# Altium footprint library DSUB.PcbLib: 51 footprints (part 3 of 4)
Each footprint in its own frame and in the unit in brackets; x right, y up, seen from the top. Pads: shape width x height; smd on the part's side, far side on the other; paste and mask are expansions set on the pad; w line width, h text height; cw(c..) or ccw(c..) is an arc to the next point about the centre after c.
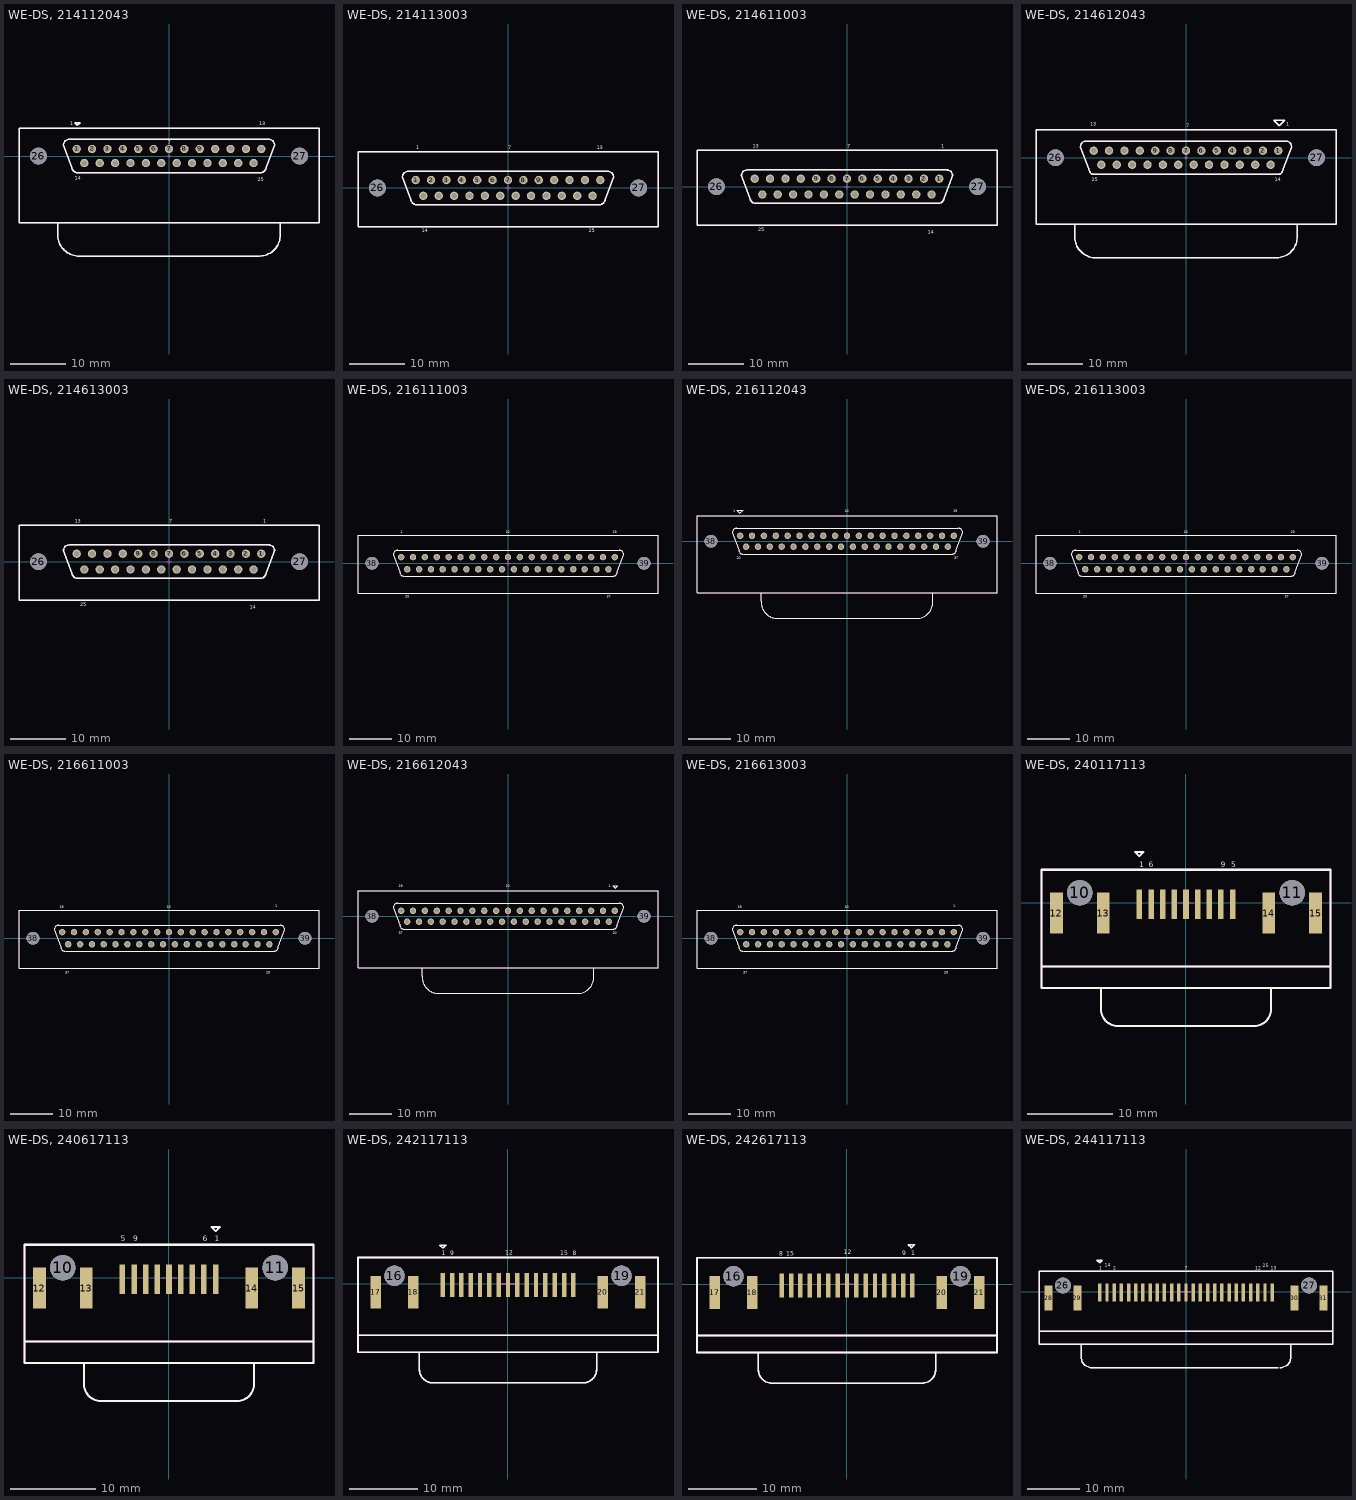
[diagram p2: the footprints below, top view; thin cyan lines are the x and y axes]

## WE-DS, 214112043 [mm] "D-SUB- 25P, MALE, RT ANGLE, TH"
height 12
pads (27):
  round 1.5 hole 1 unplated: 1(-16.62,1.27) 2(-13.85,1.27) 3(-11.08,1.27) 4(-8.31,1.27) 5(-5.54,1.27) 6(-2.77,1.27) 7(0,1.27) 8(2.77,1.27) 9(5.54,1.27) 10(8.31,1.27) 11(11.08,1.27) 12(13.85,1.27) 13(16.62,1.27) 14(-15.24,-1.27) 15(-12.47,-1.27) 16(-9.7,-1.27) 17(-6.93,-1.27) 18(-4.16,-1.27) 19(-1.39,-1.27) 20(1.38,-1.27) 21(4.15,-1.27) 22(6.92,-1.27) 23(9.69,-1.27) 24(12.46,-1.27) 25(15.23,-1.27)
  round 3 hole 3 unplated: 26(-23.5,0) 27(23.5,0)
Top Overlay:
  lines w0.254: -20,-12 -20,-14 ccw(c-16.25,-14.25) -16.5,-18 16,-18 ccw(c16.25,-14.25) 20,-14.5 20,-12 ; -16.5,5.5 -16.5,5.5 ; -16.5,5.5 -17,6 -16,6 -16.5,5.5 ; -27,-12 27,-12 27,5 -27,5 -27,-12 ; -19,2 cw(c-18,2) -18,3 18,3 cw(c18,2) 19,2 17.5,-2 cw(c16.5,-2) 16.5,-3 -16.5,-3 cw(c-16.5,-2) -17.5,-2 -19,2
  text "1" at -17.75,5.5 h0.64
  text "14" at -17,-4.25 h0.64
  text "7" at -0.2,2.1 h0.64
  text "13" at 16.25,5.5 h0.64
  text "25" at 16,-4.5 h0.64
Mechanical 15:
  lines w0.254: -20,-12 -20,-14 ccw(c-16.25,-14.25) -16.5,-18 16,-18 ccw(c16.25,-14.25) 20,-14.5 20,-12 ; -0.25,0 0.25,0 ; 0,-0.25 0,0.25 ; -27,-12 -27,5 27,5 27,-12 -27,-12 ; -19,2 cw(c-18,2) -18,3 18,3 cw(c18,2) 19,2 17.5,-2 cw(c16.5,-2) 16.5,-3 -16.5,-3 cw(c-16.5,-2) -17.5,-2 -19,2
3D body "214112043.stp": height 13.2, standoff -3.6, extent -26.55,-17.5 26.55,4.2

## WE-DS, 214113003 [mm] "D-SUB- 25P, MALE, SOLDER BUCKET,TH"
height 12
pads (27):
  round 1.5 hole 1 unplated: 1(-16.62,1.42) 2(-13.85,1.42) 3(-11.08,1.42) 4(-8.31,1.42) 5(-5.54,1.42) 6(-2.77,1.42) 7(0,1.42) 8(2.77,1.42) 9(5.54,1.42) 10(8.31,1.42) 11(11.08,1.42) 12(13.85,1.42) 13(16.62,1.42) 14(-15.24,-1.42) 15(-12.47,-1.42) 16(-9.7,-1.42) 17(-6.93,-1.42) 18(-4.16,-1.42) 19(-1.39,-1.42) 20(1.38,-1.42) 21(4.15,-1.42) 22(6.92,-1.42) 23(9.69,-1.42) 24(12.46,-1.42) 25(15.23,-1.42)
  round 3 hole 3 unplated: 26(-23.5,0) 27(23.5,0)
Top Overlay:
  lines w0.254: -27,-7 -27,6.5 27,6.5 27,-7 -27,-7 ; -19,2 cw(c-18,2) -18,3 18,3 cw(c18,2) 19,2 17.5,-2 cw(c16.5,-2) 16.5,-3 -16.5,-3 cw(c-16.5,-2) -17.5,-2 -19,2
  text "14" at -15.5,-8 h0.64
  text "25" at 14.5,-8 h0.64
  text "13" at 16,7 h0.64
  text "7" at 0,7 h0.64
  text "1" at -16.5,7 h0.64
Mechanical 15:
  lines w0.102: -0.5,0 0.5,0 ; 0,-0.5 0,0.5
  lines w0.254: -27,-7 27,-7 27,6.5 -27,6.5 -27,-7 ; -19,2 cw(c-18,2) -18,3 18,3 cw(c18,2) 19,2 17.5,-2 cw(c16.5,-2) 16.5,-3 -16.5,-3 cw(c-16.5,-2) -17.5,-2 -19,2

## WE-DS, 214611003 [mm] "D-SUB- 25P, FEMALE, STRAIGHT, TH"
height 12
pads (27):
  round 1.5 hole 1 unplated: 1(16.62,1.42) 2(13.85,1.42) 3(11.08,1.42) 4(8.31,1.42) 5(5.54,1.42) 6(2.77,1.42) 7(0,1.42) 8(-2.77,1.42) 9(-5.54,1.42) 10(-8.31,1.42) 11(-11.08,1.42) 12(-13.85,1.42) 13(-16.62,1.42) 14(15.23,-1.42) 15(12.46,-1.42) 16(9.69,-1.42) 17(6.92,-1.42) 18(4.15,-1.42) 19(1.38,-1.42) 20(-1.39,-1.42) 21(-4.16,-1.42) 22(-6.93,-1.42) 23(-9.7,-1.42) 24(-12.47,-1.42) 25(-15.24,-1.42)
  round 3 hole 3 unplated: 26(-23.5,0) 27(23.5,0)
Top Overlay:
  lines w0.254: -27,-7 27,-7 27,6.5 -27,6.5 -27,-7 ; -19,2 cw(c-18,2) -18,3 18,3 cw(c18,2) 19,2 17.5,-2 cw(c16.5,-2) 16.5,-3 -16.5,-3 cw(c-16.5,-2) -17.5,-2 -19,2
  text "13" at -17,7 h0.64
  text "7" at 0,7 h0.64
  text "1" at 17,7 h0.64
  text "14" at 14.5,-8.5 h0.64
  text "25" at -16,-8 h0.64
Mechanical 15:
  lines w0.102: -0.5,0 0.5,0 ; 0,-0.5 0,0.5
  lines w0.254: -27,-7 -27,6.5 27,6.5 27,-7 -27,-7 ; -19,2 cw(c-18,2) -18,3 18,3 cw(c18,2) 19,2 17.5,-2 cw(c16.5,-2) 16.5,-3 -16.5,-3 cw(c-16.5,-2) -17.5,-2 -19,2

## WE-DS, 214612043 [mm] "D-SUB- 25P, FEMALE, RT ANGLE, TH"
height 12
pads (27):
  round 1.5 hole 1 unplated: 1(16.62,1.27) 2(13.85,1.27) 3(11.08,1.27) 4(8.31,1.27) 5(5.54,1.27) 6(2.77,1.27) 7(0,1.27) 8(-2.77,1.27) 9(-5.54,1.27) 10(-8.31,1.27) 11(-11.08,1.27) 12(-13.85,1.27) 13(-16.62,1.27) 14(15.23,-1.27) 15(12.46,-1.27) 16(9.69,-1.27) 17(6.92,-1.27) 18(4.15,-1.27) 19(1.38,-1.27) 20(-1.39,-1.27) 21(-4.16,-1.27) 22(-6.93,-1.27) 23(-9.7,-1.27) 24(-12.47,-1.27) 25(-15.24,-1.27)
  round 3 hole 3 unplated: 26(-23.5,0) 27(23.5,0)
Top Overlay:
  lines w0.254: -20,-12 -20,-14 ccw(c-16.25,-14.25) -16.5,-18 16,-18 ccw(c16.25,-14.25) 20,-14.5 20,-12 ; 16.75,5.75 15.75,6.75 17.75,6.75 16.75,5.75 ; 16.75,5.75 16.75,5.75 ; -27,-12 27,-12 27,5 -27,5 -27,-12 ; -19,2 cw(c-18,2) -18,3 18,3 cw(c18,2) 19,2 17.5,-2 cw(c16.5,-2) 16.5,-3 -16.5,-3 cw(c-16.5,-2) -17.5,-2 -19,2
  text "7" at 0,5.5 h0.64
  text "14" at 16,-4.25 h0.64
  text "1" at 18,5.75 h0.64
  text "13" at -17.25,5.75 h0.64
  text "25" at -17,-4.25 h0.64
Mechanical 15:
  lines w0.254: -20,-12 -20,-14 ccw(c-16.25,-14.25) -16.5,-18 16,-18 ccw(c16.25,-14.25) 20,-14.5 20,-12 ; -0.25,0 0.25,0 ; 0,-0.25 0,0.25 ; -27,-12 -27,5 27,5 27,-12 -27,-12 ; -19,2 cw(c-18,2) -18,3 18,3 cw(c18,2) 19,2 17.5,-2 cw(c16.5,-2) 16.5,-3 -16.5,-3 cw(c-16.5,-2) -17.5,-2 -19,2

## WE-DS, 214613003 [mm] "D-SUB- 25P, FEMALE, SOLDER BUCKET, TH"
height 12
pads (27):
  round 1.5 hole 1 unplated: 1(16.62,1.42) 2(13.85,1.42) 3(11.08,1.42) 4(8.31,1.42) 5(5.54,1.42) 6(2.77,1.42) 7(0,1.42) 8(-2.77,1.42) 9(-5.54,1.42) 10(-8.31,1.42) 11(-11.08,1.42) 12(-13.85,1.42) 13(-16.62,1.42) 14(15.23,-1.42) 15(12.46,-1.42) 16(9.69,-1.42) 17(6.92,-1.42) 18(4.15,-1.42) 19(1.38,-1.42) 20(-1.39,-1.42) 21(-4.16,-1.42) 22(-6.93,-1.42) 23(-9.7,-1.42) 24(-12.47,-1.42) 25(-15.24,-1.42)
  round 3 hole 3 unplated: 26(-23.5,0) 27(23.5,0)
Top Overlay:
  lines w0.254: -27,-7 -27,6.5 27,6.5 27,-7 -27,-7 ; -19,2 cw(c-18,2) -18,3 18,3 cw(c18,2) 19,2 17.5,-2 cw(c16.5,-2) 16.5,-3 -16.5,-3 cw(c-16.5,-2) -17.5,-2 -19,2
  text "25" at -16,-8 h0.64
  text "14" at 14.5,-8.5 h0.64
  text "1" at 17,7 h0.64
  text "7" at 0,7 h0.64
  text "13" at -17,7 h0.64
Mechanical 15:
  lines w0.102: -0.5,0 0.5,0 ; 0,-0.5 0,0.5
  lines w0.254: -27,-7 27,-7 27,6.5 -27,6.5 -27,-7 ; -19,2 cw(c-18,2) -18,3 18,3 cw(c18,2) 19,2 17.5,-2 cw(c16.5,-2) 16.5,-3 -16.5,-3 cw(c-16.5,-2) -17.5,-2 -19,2

## WE-DS, 216111003 [mm] "D-SUB- 37P, MALE, STRAIGHT, TH"
height 12
pads (39):
  round 1.5 hole 1 unplated: 1(-24.93,1.42) 2(-22.16,1.42) 3(-19.39,1.42) 4(-16.62,1.42) 5(-13.85,1.42) 6(-11.08,1.42) 7(-8.31,1.42) 8(-5.54,1.42) 9(-2.77,1.42) 10(0,1.42) 11(2.77,1.42) 12(5.54,1.42) 13(8.31,1.42) 14(11.08,1.42) 15(13.85,1.42) 16(16.62,1.42) 17(19.39,1.42) 18(22.16,1.42) 19(24.93,1.42) 20(-23.52,-1.42) 21(-20.75,-1.42) 22(-17.98,-1.42) 23(-15.24,-1.42) 24(-12.47,-1.42) 25(-9.7,-1.42) 26(-6.93,-1.42) 27(-4.16,-1.42) 28(-1.39,-1.42) 29(1.38,-1.42) 30(4.15,-1.42) 31(6.92,-1.42) 32(9.69,-1.42) 33(12.46,-1.42) 34(15.23,-1.42) 35(17.88,-1.42) 36(20.65,-1.42) 37(23.42,-1.42)
  round 3 hole 3 unplated: 38(-31.75,0) 39(31.75,0)
Top Overlay:
  lines w0.254: -26,3 26,3 cw(c26,2) 27,2 25.5,-2 cw(c24.5,-2) 24.5,-3 -24,-3 ; -25.75,3 ccw(c-25.75,2) -26.75,2 -25.25,-2 ccw(c-24.25,-2) -24.25,-3 ; -35,-7 35,-7 35,6.5 -35,6.5 -35,-7
  text "1" at -25,7 h0.64
  text "10" at -0.5,7 h0.64
  text "19" at 24.5,7 h0.64
  text "37" at 23,-8 h0.64
  text "20" at -24,-8 h0.64
Mechanical 15:
  lines w0.102: -0.5,0 0.5,0 ; 0,-0.5 0,0.5
  lines w0.254: -35,-7 -35,6.5 35,6.5 35,-7 -35,-7 ; -26.75,2 cw(c-25.75,2) -25.75,3 26,3 cw(c26,2) 27,2 25.5,-2 cw(c24.5,-2) 24.5,-3 -24.25,-3 cw(c-24.25,-2) -25.25,-2 -26.75,2

## WE-DS, 216112043 [mm] "D-SUB- 37P, MALE, RT ANGLE, TH"
height 12
pads (39):
  round 1.5 hole 1 unplated: 1(-24.93,1.27) 2(-22.16,1.27) 3(-19.39,1.27) 4(-16.62,1.27) 5(-13.85,1.27) 6(-11.08,1.27) 7(-8.31,1.27) 8(-5.54,1.27) 9(-2.77,1.27) 10(0,1.27) 11(2.77,1.27) 12(5.54,1.27) 13(8.31,1.27) 14(11.08,1.27) 15(13.85,1.27) 16(16.62,1.27) 17(19.39,1.27) 18(22.16,1.27) 19(24.93,1.27) 20(-23.55,-1.27) 21(-20.78,-1.27) 22(-18.01,-1.27) 23(-15.24,-1.27) 24(-12.47,-1.27) 25(-9.7,-1.27) 26(-6.93,-1.27) 27(-4.16,-1.27) 28(-1.39,-1.27) 29(1.38,-1.27) 30(4.15,-1.27) 31(6.92,-1.27) 32(9.69,-1.27) 33(12.46,-1.27) 34(15.23,-1.27) 35(18,-1.27) 36(20.77,-1.27) 37(23.54,-1.27)
  round 3 hole 3 unplated: 38(-31.75,0) 39(31.75,0)
Top Overlay:
  lines w0.254: -26,3 26,3 cw(c26,2) 27,2 25.5,-2 cw(c24.5,-2) 24.5,-3 -24,-3 ; -25.75,3 ccw(c-25.75,2) -26.75,2 -25.25,-2 ccw(c-24.25,-2) -24.25,-3 ; -20,-12 -20,-14 ccw(c-16.25,-14.25) -16.5,-18 16,-18 ccw(c16.25,-14.25) 20,-14.5 20,-12 ; -24.75,6.75 -25,6.5 -25.75,7.25 -25.5,7.25 -24.5,7.25 -24.25,7.25 -24.75,6.75 ; -24.75,6.75 -24.75,6.75 ; -35,-12 -35,6 35,6 35,-12 -35,-12
  text "1" at -26.5,6.75 h0.64
  text "10" at -0.5,6.75 h0.64
  text "19" at 24.75,6.75 h0.64
  text "37" at 25,-4.25 h0.64
  text "20" at -25.75,-4.25 h0.64
Mechanical 15:
  lines w0.254: -20,-12 -20,-14 ccw(c-16.25,-14.25) -16.5,-18 16,-18 ccw(c16.25,-14.25) 20,-14.5 20,-12 ; -0.25,0 0.25,0 ; 0,-0.25 0,0.25 ; -35,-12 35,-12 35,6 -35,6 -35,-12 ; -26.75,2 cw(c-25.75,2) -25.75,3 26,3 cw(c26,2) 27,2 25.5,-2 cw(c24.5,-2) 24.5,-3 -24.25,-3 cw(c-24.25,-2) -25.25,-2 -26.75,2

## WE-DS, 216113003 [mm] "D-SUB- 37P, MALE, SOLDER BUCKET, TH"
height 12
pads (39):
  round 1.5 hole 1 unplated: 1(-24.93,1.42) 2(-22.16,1.42) 3(-19.39,1.42) 4(-16.62,1.42) 5(-13.85,1.42) 6(-11.08,1.42) 7(-8.31,1.42) 8(-5.54,1.42) 9(-2.77,1.42) 10(0,1.42) 11(2.77,1.42) 12(5.54,1.42) 13(8.31,1.42) 14(11.08,1.42) 15(13.85,1.42) 16(16.62,1.42) 17(19.39,1.42) 18(22.16,1.42) 19(24.93,1.42) 20(-23.52,-1.42) 21(-20.75,-1.42) 22(-17.98,-1.42) 23(-15.24,-1.42) 24(-12.47,-1.42) 25(-9.7,-1.42) 26(-6.93,-1.42) 27(-4.16,-1.42) 28(-1.39,-1.42) 29(1.38,-1.42) 30(4.15,-1.42) 31(6.92,-1.42) 32(9.69,-1.42) 33(12.46,-1.42) 34(15.23,-1.42) 35(17.88,-1.42) 36(20.65,-1.42) 37(23.42,-1.42)
  round 3 hole 3 unplated: 38(-31.75,0) 39(31.75,0)
Top Overlay:
  lines w0.254: -26,3 26,3 cw(c26,2) 27,2 25.5,-2 cw(c24.5,-2) 24.5,-3 -24,-3 ; -25.75,3 ccw(c-25.75,2) -26.75,2 -25.25,-2 ccw(c-24.25,-2) -24.25,-3 ; -35,-7 -35,6.5 35,6.5 35,-7 -35,-7
  text "20" at -24,-8 h0.64
  text "37" at 23,-8 h0.64
  text "19" at 24.5,7 h0.64
  text "10" at -0.5,7 h0.64
  text "1" at -25,7 h0.64
Mechanical 15:
  lines w0.102: -0.5,0 0.5,0 ; 0,-0.5 0,0.5
  lines w0.254: -35,-7 35,-7 35,6.5 -35,6.5 -35,-7 ; -26.75,2 cw(c-25.75,2) -25.75,3 26,3 cw(c26,2) 27,2 25.5,-2 cw(c24.5,-2) 24.5,-3 -24.25,-3 cw(c-24.25,-2) -25.25,-2 -26.75,2

## WE-DS, 216611003 [mm] "D-SUB- 37P, FEMALE, STRAIGHT, TH"
height 12
pads (39):
  round 1.5 hole 1 unplated: 1(24.93,1.42) 2(22.16,1.42) 3(19.39,1.42) 4(16.62,1.42) 5(13.85,1.42) 6(11.08,1.42) 7(8.31,1.42) 8(5.54,1.42) 9(2.77,1.42) 10(0,1.42) 11(-2.77,1.42) 12(-5.54,1.42) 13(-8.31,1.42) 14(-11.08,1.42) 15(-13.85,1.42) 16(-16.62,1.42) 17(-19.39,1.42) 18(-22.16,1.42) 19(-24.93,1.42) 20(23.42,-1.42) 21(20.65,-1.42) 22(17.88,-1.42) 23(15.23,-1.42) 24(12.46,-1.42) 25(9.69,-1.42) 26(6.92,-1.42) 27(4.15,-1.42) 28(1.38,-1.42) 29(-1.39,-1.42) 30(-4.16,-1.42) 31(-6.93,-1.42) 32(-9.7,-1.42) 33(-12.47,-1.42) 34(-15.24,-1.42) 35(-17.98,-1.42) 36(-20.75,-1.42) 37(-23.52,-1.42)
  round 3 hole 3 unplated: 38(-31.75,0) 39(31.75,0)
Top Overlay:
  lines w0.254: -26,3 26,3 cw(c26,2) 27,2 25.5,-2 cw(c24.5,-2) 24.5,-3 -24,-3 ; -25.75,3 ccw(c-25.75,2) -26.75,2 -25.25,-2 ccw(c-24.25,-2) -24.25,-3 ; -35,-7 -35,6.5 35,6.5 35,-7 -35,-7
  text "20" at 22.75,-8.25 h0.64
  text "1" at 24.75,7.25 h0.64
  text "37" at -24.25,-8.25 h0.64
  text "19" at -25.5,7 h0.64
  text "10" at -0.5,7 h0.64
Mechanical 15:
  lines w0.102: -0.5,0 0.5,0 ; 0,-0.5 0,0.5
  lines w0.254: -35,-7 35,-7 35,6.5 -35,6.5 -35,-7 ; -26.75,2 cw(c-25.75,2) -25.75,3 26,3 cw(c26,2) 27,2 25.5,-2 cw(c24.5,-2) 24.5,-3 -24.25,-3 cw(c-24.25,-2) -25.25,-2 -26.75,2

## WE-DS, 216612043 [mm] "D-SUB- 37P, FEMALE, RT ANGLE, TH"
height 12
pads (39):
  round 1.5 hole 1 unplated: 1(24.93,1.27) 2(22.16,1.27) 3(19.39,1.27) 4(16.62,1.27) 5(13.85,1.27) 6(11.08,1.27) 7(8.31,1.27) 8(5.54,1.27) 9(2.77,1.27) 10(0,1.27) 11(-2.77,1.27) 12(-5.54,1.27) 13(-8.31,1.27) 14(-11.08,1.27) 15(-13.85,1.27) 16(-16.62,1.27) 17(-19.39,1.27) 18(-22.16,1.27) 19(-24.93,1.27) 20(23.54,-1.27) 21(20.77,-1.27) 22(18,-1.27) 23(15.23,-1.27) 24(12.46,-1.27) 25(9.69,-1.27) 26(6.92,-1.27) 27(4.15,-1.27) 28(1.38,-1.27) 29(-1.39,-1.27) 30(-4.16,-1.27) 31(-6.93,-1.27) 32(-9.7,-1.27) 33(-12.47,-1.27) 34(-15.24,-1.27) 35(-18.01,-1.27) 36(-20.78,-1.27) 37(-23.55,-1.27)
  round 3 hole 3 unplated: 38(-31.75,0) 39(31.75,0)
Top Overlay:
  lines w0.254: -20,-12 -20,-14 ccw(c-16.25,-14.25) -16.5,-18 16,-18 ccw(c16.25,-14.25) 20,-14.5 20,-12 ; -35,-12 35,-12 35,6 -35,6 -35,-12 ; -26.75,2 cw(c-25.75,2) -25.75,3 26,3 cw(c26,2) 27,2 25.5,-2 cw(c24.5,-2) 24.5,-3 -24.25,-3 cw(c-24.25,-2) -25.25,-2 -26.75,2 ; 24.4,7.1 25,6.5 25.6,7.1 24.4,7.1
  text "19" at -25.5,6.75 h0.64
  text "10" at -0.5,6.75 h0.64
  text "1" at 23.5,6.75 h0.64
  text "20" at 24.5,-4.25 h0.64
  text "37" at -25.5,-4.25 h0.64
Mechanical 15:
  lines w0.254: -24.25,-3 cw(c-24.25,-2) -25.25,-2 -26.75,2 cw(c-25.75,2) -25.75,3 26,3 cw(c26,2) 27,2 25.5,-2 cw(c24.5,-2) 24.5,-3 ; -24,-3 24.75,-3 ; -20,-12 -20,-14 ccw(c-16.25,-14.25) -16.5,-18 16,-18 ccw(c16.25,-14.25) 20,-14.5 20,-12 ; -0.25,0 0.25,0 ; 0,-0.25 0,0.25 ; -35,-12 35,-12 35,6 -35,6 -35,-12 ; 25,6.5 25,6.5

## WE-DS, 216613003 [mm] "D-SUB- 37P, FEMALE, SOLDER BUCKET, TH"
height 12
pads (39):
  round 1.5 hole 1 unplated: 1(24.93,1.42) 2(22.16,1.42) 3(19.39,1.42) 4(16.62,1.42) 5(13.85,1.42) 6(11.08,1.42) 7(8.31,1.42) 8(5.54,1.42) 9(2.77,1.42) 10(0,1.42) 11(-2.77,1.42) 12(-5.54,1.42) 13(-8.31,1.42) 14(-11.08,1.42) 15(-13.85,1.42) 16(-16.62,1.42) 17(-19.39,1.42) 18(-22.16,1.42) 19(-24.93,1.42) 20(23.42,-1.42) 21(20.65,-1.42) 22(17.88,-1.42) 23(15.23,-1.42) 24(12.46,-1.42) 25(9.69,-1.42) 26(6.92,-1.42) 27(4.15,-1.42) 28(1.38,-1.42) 29(-1.39,-1.42) 30(-4.16,-1.42) 31(-6.93,-1.42) 32(-9.7,-1.42) 33(-12.47,-1.42) 34(-15.24,-1.42) 35(-17.98,-1.42) 36(-20.75,-1.42) 37(-23.52,-1.42)
  round 3 hole 3 unplated: 38(-31.75,0) 39(31.75,0)
Top Overlay:
  lines w0.254: -26,3 26,3 cw(c26,2) 27,2 25.5,-2 cw(c24.5,-2) 24.5,-3 -24,-3 ; -25.75,3 ccw(c-25.75,2) -26.75,2 -25.25,-2 ccw(c-24.25,-2) -24.25,-3 ; -35,-7 -35,6.5 35,6.5 35,-7 -35,-7
  text "20" at 22.75,-8.25 h0.64
  text "1" at 24.75,7.25 h0.64
  text "37" at -24.25,-8.25 h0.64
  text "19" at -25.5,7 h0.64
  text "10" at -0.5,7 h0.64
Mechanical 15:
  lines w0.102: -0.5,0 0.5,0 ; 0,-0.5 0,0.5
  lines w0.254: -35,-7 35,-7 35,6.5 -35,6.5 -35,-7 ; -26.75,2 cw(c-25.75,2) -25.75,3 26,3 cw(c26,2) 27,2 25.5,-2 cw(c24.5,-2) 24.5,-3 -24.25,-3 cw(c-24.25,-2) -25.25,-2 -26.75,2

## WE-DS, 240117113 [mm] "D-SUB- 9P, MALE, RT ANGLE, SMT"
height 12.4
pads (15):
  rect 0.65x3.5 smd: 1(-5.48,-0.15) 2(-2.74,-0.15) 3(0,-0.15) 4(2.74,-0.15) 5(5.48,-0.15) 6(-4.11,-0.15) 7(-1.37,-0.15) 8(1.37,-0.15) 9(4.11,-0.15)
  round 3 hole 3 unplated: 10(-12.5,1.2) 11(12.5,1.2)
  rect 1.5x4.8 smd: 12(-15.25,-1.2) 13(-9.75,-1.2) 14(9.75,-1.2) 15(15.25,-1.2)
Top Overlay:
  lines w0.254: -10,-10 -10,-12.5 ccw(c-8,-12.5) -8,-14.5 8,-14.5 ccw(c8,-12.5) 10,-12.5 10,-10 ; -17,-7.5 -17,-10 17,-10 17,-7.5 ; -17,-7.5 -17,3.9 17,3.9 17,-7.5 ; -17,-7.5 17,-7.5 ; -6,6 -5.5,6 -5,6 -5.5,5.5 -6,6
  text "1" at -5.5,4.2 h0.64
  text "5" at 5.3,4.2 h0.64
  text "9" at 4.1,4.2 h0.64
  text "6" at -4.4,4.2 h0.64
Mechanical 15:
  lines w0.102: -0.9,0 0.9,0 ; 0,-0.9 0,0.9
  lines w0.254: -10,-10 -10,-12.5 ccw(c-8,-12.5) -8,-14.5 8,-14.5 ccw(c8,-12.5) 10,-12.5 10,-10 ; -17,-7.5 -17,-10 17,-10 17,-7.5 ; -17,-7.5 -17,3.9 17,3.9 17,-7.5 ; -17,-7.5 17,-7.5
3D body "240117113.stp": height 12.7, standoff -2.8, extent -15.5,-14.3 15.5,4

## WE-DS, 240617113 [mm] "D-SUB- 9P, FEMALE, RT ANGLE, SMT"
height 12.4
pads (15):
  rect 0.65x3.5 smd: 1(5.48,-0.15) 2(2.74,-0.15) 3(0,-0.15) 4(-2.74,-0.15) 5(-5.48,-0.15) 6(4.11,-0.15) 7(1.37,-0.15) 8(-1.37,-0.15) 9(-4.11,-0.15)
  round 3 hole 3 unplated: 10(-12.5,1.2) 11(12.5,1.2)
  rect 1.5x4.8 smd: 12(-15.25,-1.2) 13(-9.75,-1.2) 14(9.75,-1.2) 15(15.25,-1.2)
Top Overlay:
  lines w0.254: -10,-10 -10,-12.5 ccw(c-8,-12.5) -8,-14.5 8,-14.5 ccw(c8,-12.5) 10,-12.5 10,-10 ; -17,-7.5 -17,-10 17,-10 17,-7.5 ; -17,-7.5 -17,3.9 17,3.9 17,-7.5 ; -17,-7.5 17,-7.5 ; 5,6 5.5,5.5 6,6 5.5,6 5,6
  text "1" at 5.4,4.3 h0.64
  text "5" at -5.7,4.3 h0.64
  text "9" at -4.2,4.3 h0.64
  text "6" at 4,4.3 h0.64
Mechanical 15:
  lines w0.102: -0.9,0 0.9,0 ; 0,-0.9 0,0.9
  lines w0.254: -10,-10 -10,-12.5 ccw(c-8,-12.5) -8,-14.5 8,-14.5 ccw(c8,-12.5) 10,-12.5 10,-10 ; -17,-7.5 -17,-10 17,-10 17,-7.5 ; -17,-7.5 -17,3.9 17,3.9 17,-7.5 ; -17,-7.5 17,-7.5
3D body "240617113.stp": height 12.7, standoff -2.8, extent -15.5,-14.45 15.5,4

## WE-DS, 242117113 [mm] "D-SUB- 15P, MALE, RT ANGLE, SMT"
height 12.4
pads (21):
  rect 0.65x3.5 smd: 1(-9.57,-0.15) 2(-6.83,-0.15) 3(-4.11,-0.15) 4(-1.37,-0.15) 5(1.37,-0.15) 6(4.11,-0.15) 7(6.85,-0.15) 8(9.59,-0.15) 9(-8.2,-0.15) 10(-5.48,-0.15) 11(-2.74,-0.15) 12(0,-0.15) 13(2.74,-0.15) 14(5.48,-0.15) 15(8.22,-0.15)
  round 3 hole 3 unplated: 16(-16.65,1.2) 19(16.65,1.2)
  rect 1.5x4.8 smd: 17(-19.4,-1.2) 18(-13.9,-1.2) 20(13.9,-1.2) 21(19.4,-1.2)
Top Overlay:
  lines w0.254: -22,-7.5 22,-7.5 ; -13,-10 -13,-12.5 ccw(c-11,-12.5) -11,-14.5 11,-14.5 ccw(c11,-12.5) 13,-12.5 13,-10 ; -10,5.7 -9.6,5.3 -9.5,5.3 -9.1,5.7 -10,5.7 ; -10,5.7 -10,5.7 ; -10,5.7 -9.9,5.7 -10,5.7 ; -22,-10 -22,3.9 22,3.9 22,-10 17,-10 -17,-10 -22,-10
  text "1" at -9.7,4.2 h0.64
  text "8" at 9.5,4.2 h0.64
  text "12" at -0.4,4.3 h0.64
  text "9" at -8.5,4.2 h0.64
  text "15" at 7.7,4.2 h0.64
Mechanical 15:
  lines w0.254: -22,-7.5 22,-7.5 ; -13,-10 -13,-12.5 ccw(c-11,-12.5) -11,-14.5 11,-14.5 ccw(c11,-12.5) 13,-12.5 13,-10 ; -0.9,0 0.9,0 ; 0,-0.9 0,0.9 ; -22,-10 -22,3.9 22,3.9 22,-10 17,-10 -17,-10 -22,-10
3D body "242117113.stp": height 12.7, standoff -2.8, extent -19.65,-14.3 19.65,4

## WE-DS, 242617113 [mm] "D-SUB- 15P, FEMALE, RT ANGLE, SMT"
height 12.4
pads (21):
  rect 0.65x3.5 smd: 1(9.59,-0.15) 2(6.85,-0.15) 3(4.11,-0.15) 4(1.37,-0.15) 5(-1.37,-0.15) 6(-4.11,-0.15) 7(-6.83,-0.15) 8(-9.57,-0.15) 9(8.22,-0.15) 10(5.48,-0.15) 11(2.74,-0.15) 12(0,-0.15) 13(-2.74,-0.15) 14(-5.48,-0.15) 15(-8.2,-0.15)
  round 3 hole 3 unplated: 16(-16.65,1.2) 19(16.65,1.2)
  rect 1.5x4.8 smd: 17(-19.4,-1.2) 18(-13.9,-1.2) 20(13.9,-1.2) 21(19.4,-1.2)
Top Overlay:
  lines w0.254: -22,-7.5 22,-7.5 ; -13,-10 -13,-12.5 ccw(c-11,-12.5) -11,-14.5 11,-14.5 ccw(c11,-12.5) 13,-12.5 13,-10 ; 9,5.8 9.9,5.8 9.5,5.4 9.4,5.4 9,5.8 ; 9,5.8 9.1,5.8 9,5.8 ; 9,5.8 9,5.8 ; -22,-10 -22,3.9 22,3.9 22,-10 17,-10 -17,-10 -22,-10
  text "1" at 9.4,4.3 h0.64
  text "8" at -9.9,4.2 h0.64
  text "12" at -0.5,4.4 h0.64
  text "9" at 8.1,4.3 h0.64
  text "15" at -8.9,4.2 h0.64
Mechanical 15:
  lines w0.254: -22,-7.5 22,-7.5 ; -13,-10 -13,-12.5 ccw(c-11,-12.5) -11,-14.5 11,-14.5 ccw(c11,-12.5) 13,-12.5 13,-10 ; -0.9,0 0.9,0 ; 0,-0.9 0,0.9 ; -22,-10 -22,3.9 22,3.9 22,-10 17,-10 -17,-10 -22,-10
3D body "242617113.stp": height 12.7, standoff -2.8, extent -19.65,-14.45 19.65,4

## WE-DS, 244117113 [mm] "D-SUB- 25P, MALE, RT ANGLE, SMT"
height 12.4
pads (31):
  rect 0.65x3.5 smd: 1(-16.45,-0.15) 2(-13.71,-0.15) 3(-10.97,-0.15) 4(-8.23,-0.15) 5(-5.49,-0.15) 6(-2.75,-0.15) 7(0,-0.15) 8(2.75,-0.15) 9(5.49,-0.15) 10(8.23,-0.15) 11(10.97,-0.15) 12(13.71,-0.15) 13(16.45,-0.15) 14(-15.08,-0.15) 15(-12.34,-0.15) 16(-9.6,-0.15) 17(-6.86,-0.15) 18(-4.12,-0.15) 19(-1.38,-0.15) 20(1.38,-0.15) 21(4.12,-0.15) 22(6.86,-0.15) 23(9.6,-0.15) 24(12.34,-0.15) 25(15.08,-0.15)
  round 3 hole 3 unplated: 26(-23.5,1.2) 27(23.5,1.2)
  rect 1.5x4.8 smd: 28(-26.25,-1.2) 29(-20.75,-1.2) 30(20.75,-1.2) 31(26.25,-1.2)
Top Overlay:
  lines w0.254: -28,-7.5 28,-7.5 ; -20,-10 -20,-12.5 ccw(c-18,-12.5) -18,-14.5 17.5,-14.5 ; 18,-14.5 ccw(c18,-12.5) 20,-12.5 20,-10 ; -28,-10 -17,-10 17,-10 28,-10 28,3.9 -28,3.9 -28,-10 ; -17,6 -16.5,5.5 -16,6 -17,6
  text "2" at -13.9,4.2 h0.64
  text "25" at 14.7,4.7 h0.64
  text "13" at 16.2,4.2 h0.64
  text "7" at -0.2,4.2 h0.64
  text "14" at -15.5,4.8 h0.64
  text "1" at -16.6,4.2 h0.64
  text "12" at 13.2,4.2 h0.64
Mechanical 15:
  lines w0.254: -28,-7.5 28,-7.5 ; -20,-10 -20,-12.5 ccw(c-18,-12.5) -18,-14.5 18,-14.5 ccw(c18,-12.5) 20,-12.5 20,-10 ; -0.9,0 0.9,0 ; 0,-0.9 0,0.9 ; -28,-10 -17,-10 17,-10 28,-10 28,3.9 -28,3.9 -28,-10